# Altium footprint library jointbar.PCBLIB: 166 footprints (part 11 of 11)
Each footprint in its own frame and in the unit in brackets; x right, y up, seen from the top. Pads: shape width x height; smd on the part's side, far side on the other; paste and mask are expansions set on the pad; w line width, h text height; cw(c..) or ccw(c..) is an arc to the next point about the centre after c.
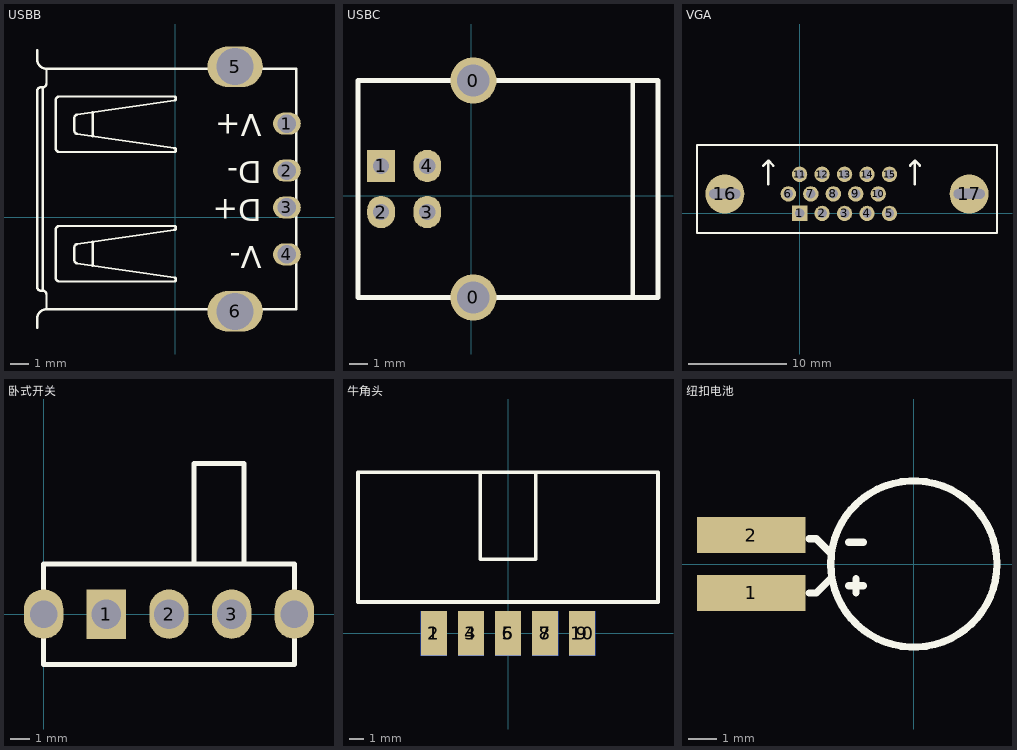
[diagram p10: the footprints below, top view; thin cyan lines are the x and y axes]

## USBB [mm]
pads (6):
  oval 1.5x1.2 hole 1: 1(6.044,5.062) 2(6.044,2.522) 3(6.044,0.522) 4(6.044,-2.018)
  oval 3x2.2 hole 2: 5(3.244,8.132) 6(3.244,-5.088)
TopOverlay:
  lines w0.127: -7.456,-5.978 -7.456,-5.478 cw(c-6.956,-5.478) -6.956,-4.978 ; -7.456,9.022 -7.456,8.522 ccw(c-6.956,8.522) -6.956,8.022 ; -4.456,-2.629 -4.456,-1.328 ; -4.456,4.371 -4.456,5.672 ; 1.744,-4.978 -6.956,-4.978 ; 1.744,8.022 -6.956,8.022 ; 4.744,-4.978 6.544,-4.978 6.544,8.022 4.744,8.022 ; -7.156,-3.978 cw(c-7.156,-4.178) -6.956,-4.178 -6.956,-4.978 ; -7.156,-3.978 -7.156,7.022 ; -7.156,-3.978 -7.256,-3.978 cw(c-7.256,-3.778) -7.456,-3.778 -7.456,6.822 cw(c-7.256,6.822) -7.256,7.022 -7.156,7.022 ; -7.156,7.022 ccw(c-7.156,7.222) -6.956,7.222 -6.956,8.022 ; -6.456,-3.278 ccw(c-6.256,-3.278) -6.256,-3.478 -0.056,-3.478 ccw(c-0.056,-3.378) 0.044,-3.378 0.044,-3.365 ccw(c-0.056,-3.365) -0.042,-3.266 -5.292,-2.508 cw(c-5.256,-2.312) -5.456,-2.312 -5.456,-1.645 cw(c-5.256,-1.645) -5.292,-1.449 -0.042,-0.691 ccw(c-0.056,-0.592) 0.044,-0.592 0.044,-0.578 ccw(c-0.056,-0.578) -0.056,-0.478 -6.256,-0.478 ccw(c-6.256,-0.678) -6.456,-0.678 -6.456,-3.278 ; -6.456,3.722 ccw(c-6.256,3.722) -6.256,3.522 -0.056,3.522 ccw(c-0.056,3.622) 0.044,3.622 0.044,3.635 ccw(c-0.056,3.635) -0.042,3.734 -5.292,4.492 cw(c-5.256,4.688) -5.456,4.688 -5.456,5.355 cw(c-5.256,5.355) -5.292,5.551 -0.042,6.309 ccw(c-0.056,6.408) 0.044,6.408 0.044,6.422 ccw(c-0.056,6.422) -0.056,6.522 -6.256,6.522 ccw(c-6.256,6.322) -6.456,6.322 -6.456,3.722
  text "D-" at 4.679,3.011 h1.2
  text "D+" at 4.679,0.979 h1.2
  text "V-" at 4.679,-1.561 h1.2
  text "V+" at 4.679,5.551 h1.2
3D body "Samtec-USBR-A-S-S-O-TH.STEP": height -0.6, standoff -11.45, extent -7.048,-6.349 7.112,9.45

## USBC [mil]
pads (6):
  round 100 hole 70: 0(5,-220) 0(5,250)
  rect 60x70 hole 35: 1(-195,65)
  oval 60x70 hole 35: 2(-195,-35) 3(-95,-35) 4(-95,65)
TopOverlay:
  lines w10: -25,-220 -245,-220 -245,250 -25,250 ; 30,250 405,250 405,-220 35,-220 ; 350,-220 350,250

## VGA [mil]
pads (17):
  rect 62x62 hole 38: 1(0,0)
  round 62 hole 38: 2(90.55,0) 3(181.1,0) 4(271.65,0) 5(362.2,0) 6(-45.28,78.74) 7(45.28,78.74) 8(135.83,78.74) 9(226.38,78.74) 10(316.93,78.74) 11(0,157.48) 12(90.55,157.48) 13(181.1,157.48) 14(271.65,157.48) 15(362.2,157.48)
  round 157.48 hole 39.37 slot 125.98 at 0 deg: 16(-301.18,78.74) 17(683.07,78.74)
TopOverlay:
  lines w8: -413.39,-78.74 -413.39,275.59 795.28,275.59 795.28,-78.74 -413.39,-78.74
  lines w10: -145.67,192.91 -125.98,212.6 ; -125.98,118.11 -125.98,212.6 ; -106.3,192.91 -125.98,212.6 ; 444.88,192.91 464.57,212.6 ; 464.57,118.11 464.57,212.6 ; 484.25,192.91 464.57,212.6 ; -125.98,212.6 -125.98,212.6 ; 464.57,212.6 464.57,212.6
3D body "User Library-SLIM D-SUB RIGHT ANGLE PCB MOUNT.step": height 403.54, standoff -121.72, extent -411.52,-42.02 801.08,488.29

## 卧式开关 [mm]
pads (5):
  rect 2x2.5 hole 1.5: 1(3.175,0)
  oval 2x2.5 hole 1.5: 2(6.35,0) 3(9.525,0)
  oval 2x2.5 hole 1.4: ""(0,0) ""(12.7,0)
TopOverlay:
  lines w0.254: 7.62,2.54 7.62,7.62 10.16,7.62 10.16,2.54 ; 0,-2.54 12.7,-2.54 12.7,2.54 0,2.54 0,-2.54

## 牛角头 [mil]
height 47.24
pads (10):
  rect 70x120 smd: 1(-200,0) 3(-100,0) 5(0,0) 7(100,0) 9(200,0)
  rect 70x120 smd far side: 2(-200,0) 4(-100,0) 6(0,0) 8(100,0) 10(200,0)
TopOverlay:
  lines w10: -75,435 -75,200 75,200 75,435 ; -405,85 405,85 405,435 -405,435 -405,85

## 纽扣电池 [mil]
pads (2):
  rect 150x50 smd: 1(-225,-40) 2(-225,40)
TopOverlay:
  circle w10: c0,0 r115
  lines w10: -145,-40 -135,-40 -115,-20 ; -145,35 -135,35 -115,15 ; -90,-30 -70,-30 ; -90,30 -70,30 ; -80,-40 -80,-20